# Altium footprint library ESP.PcbLib: 12 footprints
Each footprint in its own frame and in the unit in brackets; x right, y up, seen from the top. Pads: shape width x height; smd on the part's side, far side on the other; paste and mask are expansions set on the pad; w line width, h text height; cw(c..) or ccw(c..) is an arc to the next point about the centre after c.
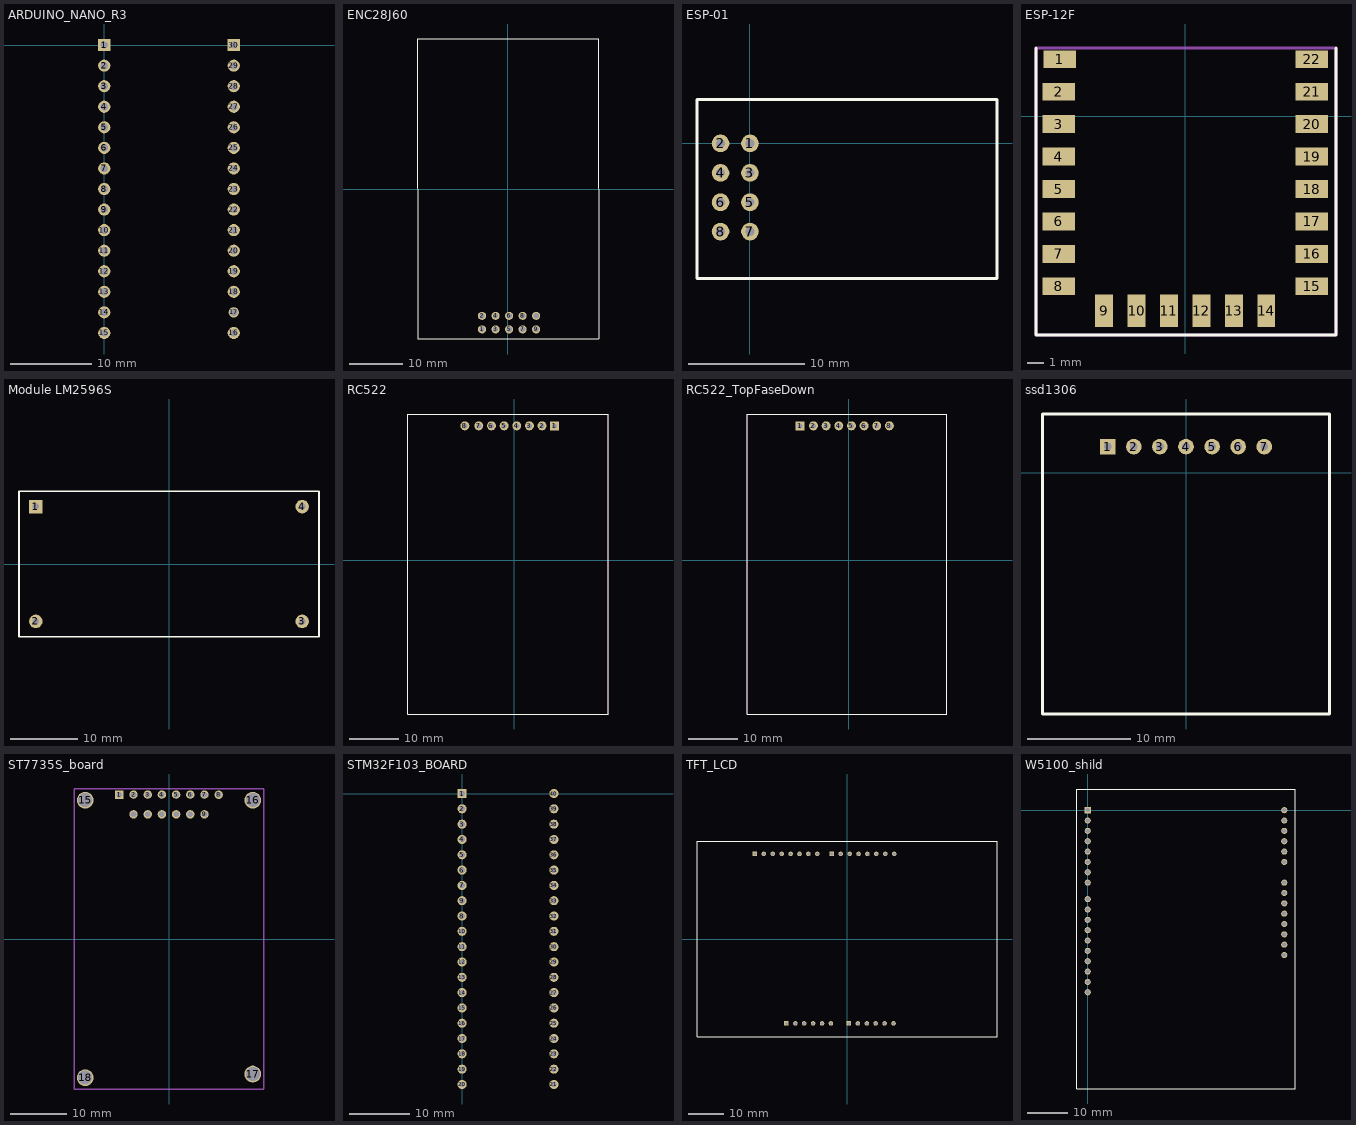
[diagram p0: the footprints below, top view; thin cyan lines are the x and y axes]

## ARDUINO_NANO_R3 [mm]
pads (30):
  rect 1.5x1.5 hole 0.9: 1(0,0) 30(16,0)
  round 1.5 hole 0.9: 2(0,-2.54) 3(0,-5.08) 4(0,-7.62) 5(0,-10.16) 6(0,-12.7) 7(0,-15.24) 8(0,-17.78) 9(0,-20.32) 10(0,-22.86) 11(0,-25.4) 12(0,-27.94) 13(0,-30.48) 14(0,-33.02) 15(0,-35.56) 16(16,-35.56) 18(16,-30.48) 19(16,-27.94) 20(16,-25.4) 21(16,-22.86) 22(16,-20.32) 23(16,-17.78) 24(16,-15.24) 25(16,-12.7) 26(16,-10.16) 27(16,-7.62) 28(16,-5.08) 29(16,-2.54)
  round 1.27 hole 0.9: 17(16,-33.02)
3D body "Arduino Nano 3.0.STEP": height 12.88, standoff -5.38, extent -1.27,-41.019 17.27,3.81

## ENC28J60 [mil]
pads (10):
  round 60 hole 39.37: 1(-190,-1035) 2(-190,-935) 3(-90,-1035) 4(-90,-935) 5(10,-1035) 6(10,-935) 7(110,-1035) 8(110,-935) 9(210,-1035) 10(210,-935)
Top Overlay:
  lines w7.87: -669.29,1110.24 669.29,1110.24 673.23,-1106.3 -665.35,-1106.3 -669.29,1110.24
3D body "ENC28J60-Module.STEP": height 610.24, standoff -39.37, extent -680,-1095.18 678.27,1160

## ESP-01 [mil]
pads (8):
  round 60 hole 30: 1(0,0) 2(-100,0) 3(0,-100) 4(-100,-100) 5(0,-200) 6(-100,-200) 7(0,-300) 8(-100,-300)
Top Overlay:
  lines w10: -180,-460 -180,150 -170,150 840,150 840,-460 -180,-460
3D body "ESP8266 ESP-01.step": height 231.4, standoff -228.35, extent -158.19,-440 818.19,130.87

## ESP-12F [mm]
pads (22):
  rect 2x1.1 smd: 1(-7.725,3.5) 2(-7.8,1.5) 3(-7.8,-0.5) 4(-7.8,-2.5) 5(-7.8,-4.5) 6(-7.8,-6.5) 7(-7.8,-8.5) 8(-7.8,-10.5) 15(7.8,-10.5) 16(7.8,-8.5) 17(7.8,-6.5) 18(7.8,-4.5) 19(7.8,-2.5) 20(7.8,-0.5) 21(7.8,1.5) 22(7.8,3.5)
  rect 1.1x2 smd: 9(-5,-12) 10(-3,-12) 11(-1,-12) 12(1,-12) 13(3,-12) 14(5,-12)
Top Overlay:
  lines w0.2: -9.2,4.2 -9.2,-13.5 9.3,-13.5 9.3,4.2
TopAssy:
  lines w0.2: -9.2,-13.5 9.3,-13.5 9.3,4.2 -9.2,4.2 -9.2,-13.5
  text ".Designator" at -4,-4.4 h1.52
3D body "EPS8266 ESP-12E.STEP": height 2.65, standoff -0.04, extent -8.005,-12.005 8.005,12

## Module LM2596S [mm]
pads (4):
  rect 2x2 hole 1: 1(-19.736,8.509)
  round 2 hole 1: 2(-19.736,-8.509) 3(19.736,-8.509) 4(19.736,8.509)
Top Overlay:
  lines w0.254: -22.225,-10.795 -22.225,10.795 22.225,10.795 22.225,-10.795 -22.225,-10.795
3D body "DC-DC MODULE LM2596s.STEP": height 13.41, standoff -0.4, extent -21.75,-10.5 21.75,10.5

## RC522 [mm]
pads (8):
  rect 1.8x1.8 hole 1: 1(8.128,26.924)
  round 1.8 hole 1: 2(5.588,26.924) 3(3.048,26.924) 4(0.508,26.924) 5(-2.032,26.924) 6(-4.572,26.924) 7(-7.112,26.924) 8(-9.906,26.924)
Top Overlay:
  lines w0.2: -21.4,-30.9 18.9,-30.9 18.9,29.3 -21.4,29.3 -21.4,-30.9
TopAssy:
  lines w0.2: -21.4,-30.9 18.9,-30.9 18.9,29.3 -21.4,29.3 -21.4,-30.9
  text ".Designator" at -6.5,10.1 h1.52
3D body "RFID.STEP": height 7.74, standoff -3.8, extent -21.27,-30.79 18.73,29.21

## RC522_TopFaseDown [mm]
pads (8):
  rect 1.8x1.8 hole 1: 1(-9.779,26.924)
  round 1.8 hole 1: 2(-7.112,26.924) 3(-4.572,26.924) 4(-2.032,26.924) 5(0.508,26.924) 6(3.048,26.924) 7(5.588,26.924) 8(8.128,26.924)
Top Overlay:
  lines w0.2: -20.447,-30.9 19.685,-30.9 19.685,29.3 -20.447,29.3 -20.447,-30.9
TopAssy:
  lines w0.2: -20.447,-30.9 19.685,-30.9 19.685,29.3 -20.447,29.3 -20.447,-30.9
  text ".Designator" at -6.5,10.1 h1.52
3D body "RFID.STEP": height 8.8, standoff -2.74, extent -20.381,-30.79 19.619,29.21

## ssd1306 [mil]
pads (7):
  rect 60x60 hole 30: 1(-300,100)
  round 60 hole 30: 2(-200,100) 3(-100,100) 4(0,100) 5(100,100) 6(200,100) 7(300,100)
Top Overlay:
  lines w10: -550,-925 -550,225 550,225 550,-925 -550,-925
3D body "SSD1306 128x64I2COLEDDisplayAdafruit.step": height 57.98, standoff -369.02, extent -525.59,-896.85 525.59,200

## ST7735S_board [mm]
pads (18):
  rect 1.5x1.5 hole 1: 1(-8.89,25.85)
  round 1.5 hole 1: 2(-6.35,25.85) 3(-3.81,25.85) 4(-1.27,25.85) 5(1.27,25.85) 6(3.81,25.85) 7(6.35,25.85) 8(8.89,25.825) 9(6.35,22.31) 10(3.81,22.31) 11(1.27,22.31) 12(-1.27,22.31) 13(-3.81,22.31) 14(-6.35,22.31)
  round 3 hole 2.5: 15(-15,24.85) 16(15,24.85) 17(15,-24.175) 18(-15,-24.825)
Mechanical 13:
  lines w0.254: -17,-26.85 17,-26.85 17,26.85 -17,26.85 -17,-26.85

## STM32F103_BOARD [mm]
pads (40):
  rect 1.5x1.5 hole 1: 1(0,0)
  round 1.5 hole 0.9: 2(0,-2.54) 3(0,-5.08) 4(0,-7.62) 5(0,-10.16) 6(0,-12.7) 7(0,-15.24) 8(0,-20.32) 9(0,-17.78) 10(0,-22.86) 11(0,-25.4) 12(0,-27.94) 13(0,-30.48) 14(0,-33.02) 15(0,-35.56) 16(0,-38.1) 17(0,-40.64) 18(0,-43.18) 19(0,-45.72) 20(0,-48.26) 21(15.24,-48.26) 22(15.24,-45.72) 23(15.24,-43.18) 24(15.24,-40.64) 25(15.24,-38.1) 26(15.24,-35.56) 27(15.24,-33.02) 28(15.24,-30.48) 29(15.24,-27.94) 30(15.24,-25.4) 31(15.24,-22.86) 32(15.24,-20.32) 33(15.24,-17.78) 34(15.24,-15.24) 35(15.24,-12.7) 36(15.24,-10.16) 37(15.24,-7.62) 38(15.24,-5.08) 39(15.24,-2.54) 40(15.24,0)
3D body "STM32F103_board.STEP": height 11.51, standoff -5.92, extent -3.556,-55.842 18.944,2.794

## TFT_LCD [mm]
pads (28):
  round 1.3 hole 0.9: 1(13.445,24.255) 2(10.905,24.255) 3(8.365,24.255) 4(5.825,24.255) 5(3.285,24.255) 6(0.745,24.255) 7(-1.795,24.255) 9(-8.458,24.255) 10(-10.998,24.255) 11(-13.538,24.255) 12(-16.078,24.255) 13(-18.618,24.255) 14(-21.158,24.255) 15(-23.698,24.255) 18(-14.735,-24.065) 19(-12.195,-24.065) 20(-9.655,-24.065) 21(-7.115,-24.065) 22(-4.575,-24.065) 24(3.095,-24.065) 25(5.635,-24.065) 26(8.175,-24.065) 27(10.715,-24.065) 28(13.255,-24.065)
  rect 1.3x1.3 hole 0.9: 8(-4.335,24.255) 16(-26.238,24.255) 17(-17.275,-24.065) 23(0.555,-24.065)
Top Overlay:
  lines w0.2: -42.745,-27.815 -42.745,27.815 42.745,27.815 42.745,-27.815 -42.745,-27.815
3D body "TFT.STEP": height 8.1, standoff -2, extent -42.745,-27.815 42.745,27.815

## W5100_shild [mm]
pads (32):
  rect 1.5x1.5 hole 1: 1(0,0)
  round 1.5 hole 1: 2(0,-2.54) 3(0,-5.08) 4(0,-7.62) 5(0,-10.16) 6(0,-12.7) 7(0,-15.24) 8(0,-17.78) 9(0,-21.844) 10(0,-24.384) 11(0,-26.924) 12(0,-29.464) 13(0,-32.004) 14(0,-34.544) 15(0,-37.084) 16(0,-39.624) 17(0,-42.164) 18(0,-44.704) 19(48.26,-35.56) 20(48.26,-33.02) 21(48.26,-30.48) 22(48.26,-27.94) 23(48.26,-25.4) 24(48.26,-22.86) 25(48.26,-20.32) 26(48.26,-17.78) 27(48.26,-12.7) 28(48.26,-10.16) 29(48.26,-7.62) 30(48.26,-5.08) 31(48.26,-2.54) 32(48.26,0)
Top Overlay:
  lines w0.254: -2.667,-68.453 -2.667,5.207 50.927,5.207 50.927,-68.453 -2.667,-68.453
3D body "W5100_SHILD.STEP": height 26.89, standoff -1.87, extent -2.54,-68.34 50.8,5.08